# Altium footprint library Mine.PcbLib: 306 footprints (part 8 of 20)
Each footprint in its own frame and in the unit in brackets; x right, y up, seen from the top. Pads: shape width x height; smd on the part's side, far side on the other; paste and mask are expansions set on the pad; w line width, h text height; cw(c..) or ccw(c..) is an arc to the next point about the centre after c.
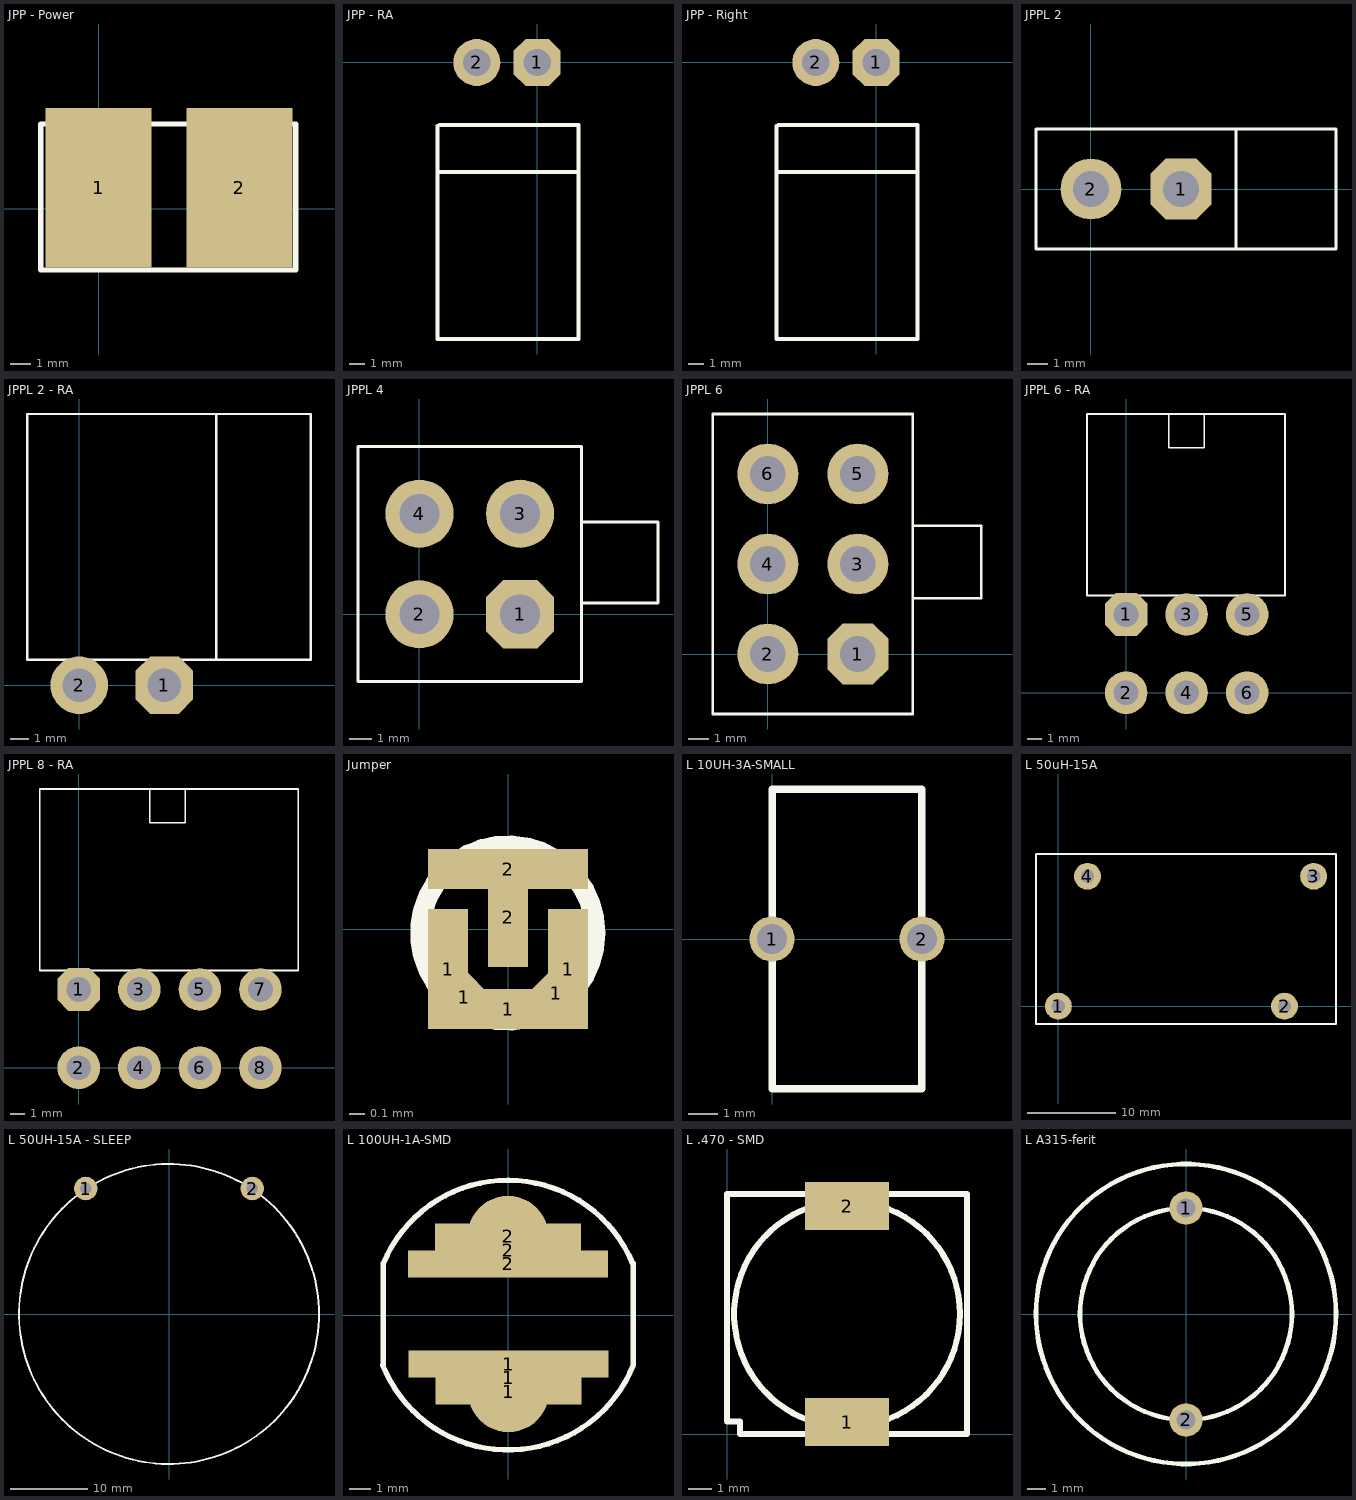
[diagram p7: the footprints below, top view; thin cyan lines are the x and y axes]

## JPP - Power [mil]
pads (2):
  rect 200x300 smd: 1(0,40) 2(265,40)
Top Overlay:
  lines w10: -109,-115 -109,160 371,160 371,-115 -109,-115

## JPP - RA [mil]
height 275.59
pads (2):
  oct 120x120 hole 70: 1(0,0)
  round 120 hole 70: 2(-154,0)
Top Overlay:
  lines w10: -255,-280 105,-280 ; -254,-162 -254,-706 106,-706 106,-161 ; -250,-160 105,-160

## JPP - Right [mil]
height 275.59
pads (2):
  oct 120x120 hole 70: 1(0,0)
  round 120 hole 70: 2(-154,0)
Top Overlay:
  lines w10: -255,-280 105,-280 ; -254,-162 -254,-706 106,-706 106,-161 ; -250,-160 105,-160

## JPPL 2 [mil]
height 511.81
pads (2):
  oct 120x120 hole 70: 1(177.17,0)
  round 120 hole 70: 2(0,0)
Top Overlay:
  lines w5: 285.43,-118.11 285.43,118.11 ; -108.27,-118.11 -108.27,118.11 482.28,118.11 482.28,-118.11 -108.27,-118.11

## JPPL 2 - RA [mil]
height 511.81
pads (2):
  oct 120x120 hole 70: 1(177.17,0)
  round 120 hole 70: 2(0,0)
Top Overlay:
  lines w5: 285.43,53.19 285.43,565 ; -108.27,53.19 -108.27,565 482.28,565 482.28,53.19 -108.27,53.19

## JPPL 4 [mil]
height 511.81
pads (4):
  oct 120x120 hole 70: 1(177.17,0)
  round 120 hole 70: 2(0,0) 3(177.17,177.17) 4(0,177.17)
Top Overlay:
  lines w5: 285.43,20 420,20 420,162.72 285.43,162.72 ; -108.27,-118.11 -108.27,295.28 285.43,295.28 285.43,-118.11 -108.27,-118.11

## JPPL 6 [mil]
height 511.81
pads (6):
  oct 120x120 hole 70: 1(177.17,0)
  round 120 hole 70: 2(0,0) 3(177.17,177.17) 4(0,177.17) 5(177.17,354.33) 6(0,354.33)
Top Overlay:
  lines w5: 285.43,110 420,110 420,252.72 285.43,252.72 ; -108.27,-118.11 285.43,-118.11 285.43,472.44 -108.27,472.44 -108.27,-118.11

## JPPL 6 - RA [mil]
height 393.7
pads (6):
  oct 120x120 hole 70: 1(0,220.47)
  round 120 hole 70: 2(0,0) 3(170.6,220.47) 4(170.6,0) 5(341.21,220.47) 6(341.21,0)
Top Overlay:
  lines w5: 120,785.47 120,690.47 220,690.47 220,785.47 ; -110,273.66 -110,785.47 447.74,785.47 447.74,273.66 -110,273.66

## JPPL 8 - RA [mil]
height 393.7
pads (8):
  oct 120x120 hole 70: 1(0,220.47)
  round 120 hole 70: 2(0,0) 3(170.6,220.47) 4(170.6,0) 5(341.21,220.47) 6(341.21,0) 7(511.81,220.47) 8(511.81,0)
Top Overlay:
  lines w5: 200,785.47 200,690.47 300,690.47 300,785.47 ; -110,273.66 618.35,273.66 618.35,785.47 -110,785.47 -110,273.66

## Jumper [mil]
pads (7):
  rect 10x30 smd: 1(-15,-10) 1(15,-10)
  rect 10x10 smd rot 45: 1(-11,-17)
  rect 40x10 smd: 1(0,-20) 2(0,15)
  rect 10x10 smd rot 135: 1(12,-16)
  rect 10x25 smd: 2(0,3)
Top Overlay:
  circle w5: c-0.07,-1 r21.93

## L 10UH-3A-SMALL [mil]
height 314.96
pads (2):
  round 60 hole 40: 1(0,0) 2(200,0)
Top Overlay:
  lines w10: 0,-200 200,-200 200,200 0,200 0,-200

## L 50uH-15A [mil]
pads (4):
  round 120 hole 60: 1(0,0) 2(1010,0) 3(1140,580) 4(130,580)
Top Overlay:
  lines w10: -100,-80 -100,680 1240,680 1240,-80 -100,-80

## L 50UH-15A - SLEEP [mil]
pads (2):
  round 120 hole 60: 1(-425,640) 2(425,640)
Top Overlay:
  circle w10: c0,0 r765

## L 100UH-1A-SMD [mil]
height 314.96
pads (6):
  round 150 smd: 1(1,-142) 2(0,146)
  rect 270x100 smd: 1(1,-116) 2(0,120)
  rect 370x50 smd: 1(1,-91) 2(0,95)
Top Overlay:
  lines w10: -232.26,-92.5 ccw(c0,0) 232.39,-92.16 ; -231,-92 -231,96 ; -230.86,95.94 cw(c0,0) 231,95.59 ; 232,-92 232,96

## L .470 - SMD [mil]
height 236.22
pads (2):
  rect 140x80 smd: 1(200,20) 2(200,380)
Top Overlay:
  circle w10: c200,200 r188.22
  lines w10: 0,21 22,21 22,0 400,0 400,400 0,400 0,21

## L A315-ferit [mil]
height 433.07
pads (2):
  round 70 hole 40: 1(0,222.44) 2(0,-222.44)
Top Overlay:
  circle w10: c0,0 r222.44
  circle w10: c0,0 r314.96